# Altium schematic symbol library jlcpcb_2025_04_resistors_extended_2512.schlib: 2667 symbols (part 7 of 14) (continued)
## FRC2512J6R8 TS
designator R?  Resistance: 6.8Ω  (hidden comment: *)
Resistor, 6.8Ω, ±5%, 1W, 200V, ±200ppm/℃, -55℃~+155℃, SMD 2512; Manufacturer: Uniroyal; Manufacturer Part Number: FRC2512J6R8 TS; Supplier 1: LCSC; Supplier Part Number 1: C2960713; JLCPCB Part Number: C2960713; Power Rating: 1W; Category: Resistors; Package Size: 2512; JLCPCB Basic Part: Yes; Tolerance: ±5%; Voltage Rating: 200V; Temperature Coefficient: ±200ppm/℃; Temperature Rating: -55℃~+155℃; ComponentLink1Description: Datasheet; ComponentLink1URL: https://wmsc.lcsc.com/wmsc/upload/file/pdf/v2/lcsc/2308241947_FOJAN-FRC2512J6R8-TS_C2960713.pdf; ComponentLink2Description: JLCPCB Part URL; ComponentLink2URL: https://jlcpcb.com/partdetail/C2960713
pins: 1, 2
1 alternate drawing of the same symbol

## FRC2512J7R5 TS
designator R?  Resistance: 7.5Ω  (hidden comment: *)
Resistor, 7.5Ω, ±5%, 1W, 200V, ±200ppm/℃, -55℃~+155℃, SMD 2512; Manufacturer: Uniroyal; Manufacturer Part Number: FRC2512J7R5 TS; Supplier 1: LCSC; Supplier Part Number 1: C2960779; JLCPCB Part Number: C2960779; Power Rating: 1W; Category: Resistors; Package Size: 2512; JLCPCB Basic Part: Yes; Tolerance: ±5%; Voltage Rating: 200V; Temperature Coefficient: ±200ppm/℃; Temperature Rating: -55℃~+155℃; ComponentLink1Description: Datasheet; ComponentLink1URL: https://wmsc.lcsc.com/wmsc/upload/file/pdf/v2/lcsc/2308241947_FOJAN-FRC2512J7R5-TS_C2960779.pdf; ComponentLink2Description: JLCPCB Part URL; ComponentLink2URL: https://jlcpcb.com/partdetail/C2960779
pins: 1, 2
1 alternate drawing of the same symbol

## FRC2512J8R2 TS
designator R?  Resistance: 8.2Ω  (hidden comment: *)
Resistor, 8.2Ω, ±5%, 1W, 200V, ±200ppm/℃, -55℃~+155℃, SMD 2512; Manufacturer: Uniroyal; Manufacturer Part Number: FRC2512J8R2 TS; Supplier 1: LCSC; Supplier Part Number 1: C2960686; JLCPCB Part Number: C2960686; Power Rating: 1W; Category: Resistors; Package Size: 2512; JLCPCB Basic Part: Yes; Tolerance: ±5%; Voltage Rating: 200V; Temperature Coefficient: ±200ppm/℃; Temperature Rating: -55℃~+155℃; ComponentLink1Description: Datasheet; ComponentLink1URL: https://wmsc.lcsc.com/wmsc/upload/file/pdf/v2/lcsc/2308241947_FOJAN-FRC2512J8R2-TS_C2960686.pdf; ComponentLink2Description: JLCPCB Part URL; ComponentLink2URL: https://jlcpcb.com/partdetail/C2960686
pins: 1, 2
1 alternate drawing of the same symbol

## FRC2512J100 TS
designator R?  Resistance: 10Ω  (hidden comment: *)
Resistor, 10Ω, ±5%, 1W, 200V, ±100ppm/℃, -55℃~+155℃, SMD 2512; Manufacturer: Uniroyal; Manufacturer Part Number: FRC2512J100 TS; Supplier 1: LCSC; Supplier Part Number 1: C2907570; JLCPCB Part Number: C2907570; Power Rating: 1W; Category: Resistors; Package Size: 2512; JLCPCB Basic Part: Yes; Tolerance: ±5%; Voltage Rating: 200V; Temperature Coefficient: ±100ppm/℃; Temperature Rating: -55℃~+155℃; ComponentLink1Description: Datasheet; ComponentLink1URL: https://wmsc.lcsc.com/wmsc/upload/file/pdf/v2/lcsc/2308241009_FOJAN-FRC2512J100-TS_C2907570.pdf; ComponentLink2Description: JLCPCB Part URL; ComponentLink2URL: https://jlcpcb.com/partdetail/C2907570
pins: 1, 2
1 alternate drawing of the same symbol

## FRC2512J101 TS
designator R?  Resistance: 100Ω  (hidden comment: *)
Resistor, 100Ω, ±5%, 1W, 200V, ±100ppm/℃, -55℃~+155℃, SMD 2512; Manufacturer: Uniroyal; Manufacturer Part Number: FRC2512J101 TS; Supplier 1: LCSC; Supplier Part Number 1: C2907569; JLCPCB Part Number: C2907569; Power Rating: 1W; Category: Resistors; Package Size: 2512; JLCPCB Basic Part: Yes; Tolerance: ±5%; Voltage Rating: 200V; Temperature Coefficient: ±100ppm/℃; Temperature Rating: -55℃~+155℃; ComponentLink1Description: Datasheet; ComponentLink1URL: https://wmsc.lcsc.com/wmsc/upload/file/pdf/v2/lcsc/2308241009_FOJAN-FRC2512J101-TS_C2907569.pdf; ComponentLink2Description: JLCPCB Part URL; ComponentLink2URL: https://jlcpcb.com/partdetail/C2907569
pins: 1, 2
1 alternate drawing of the same symbol

## FRC2512J102 TS
designator R?  Resistance: 1kΩ  (hidden comment: *)
Resistor, 1kΩ, ±5%, 1W, 200V, ±100ppm/℃, -55℃~+155℃, SMD 2512; Manufacturer: Uniroyal; Manufacturer Part Number: FRC2512J102 TS; Supplier 1: LCSC; Supplier Part Number 1: C2960674; JLCPCB Part Number: C2960674; Power Rating: 1W; Category: Resistors; Package Size: 2512; JLCPCB Basic Part: Yes; Tolerance: ±5%; Voltage Rating: 200V; Temperature Coefficient: ±100ppm/℃; Temperature Rating: -55℃~+155℃; ComponentLink1Description: Datasheet; ComponentLink1URL: https://wmsc.lcsc.com/wmsc/upload/file/pdf/v2/lcsc/2308241947_FOJAN-FRC2512J102-TS_C2960674.pdf; ComponentLink2Description: JLCPCB Part URL; ComponentLink2URL: https://jlcpcb.com/partdetail/C2960674
pins: 1, 2
1 alternate drawing of the same symbol

## FRC2512J103 TS
designator R?  Resistance: 10kΩ  (hidden comment: *)
Resistor, 10kΩ, ±5%, 1W, 200V, ±100ppm/℃, -55℃~+155℃, SMD 2512; Manufacturer: Uniroyal; Manufacturer Part Number: FRC2512J103 TS; Supplier 1: LCSC; Supplier Part Number 1: C2974112; JLCPCB Part Number: C2974112; Power Rating: 1W; Category: Resistors; Package Size: 2512; JLCPCB Basic Part: Yes; Tolerance: ±5%; Voltage Rating: 200V; Temperature Coefficient: ±100ppm/℃; Temperature Rating: -55℃~+155℃; ComponentLink1Description: Datasheet; ComponentLink1URL: https://wmsc.lcsc.com/wmsc/upload/file/pdf/v2/lcsc/2202151130_FOJAN-FRC2512J103-TS_C2974112.pdf; ComponentLink2Description: JLCPCB Part URL; ComponentLink2URL: https://jlcpcb.com/partdetail/C2974112
pins: 1, 2
1 alternate drawing of the same symbol

## FRC2512J104 TS
designator R?  Resistance: 100kΩ  (hidden comment: *)
Resistor, 100kΩ, ±5%, 1W, 200V, ±100ppm/℃, -55℃~+155℃, SMD 2512; Manufacturer: Uniroyal; Manufacturer Part Number: FRC2512J104 TS; Supplier 1: LCSC; Supplier Part Number 1: C2907568; JLCPCB Part Number: C2907568; Power Rating: 1W; Category: Resistors; Package Size: 2512; JLCPCB Basic Part: Yes; Tolerance: ±5%; Voltage Rating: 200V; Temperature Coefficient: ±100ppm/℃; Temperature Rating: -55℃~+155℃; ComponentLink1Description: Datasheet; ComponentLink1URL: https://wmsc.lcsc.com/wmsc/upload/file/pdf/v2/lcsc/2308241009_FOJAN-FRC2512J104-TS_C2907568.pdf; ComponentLink2Description: JLCPCB Part URL; ComponentLink2URL: https://jlcpcb.com/partdetail/C2907568
pins: 1, 2
1 alternate drawing of the same symbol

## FRC2512J105 TS
designator R?  Resistance: 1MΩ  (hidden comment: *)
Resistor, 1MΩ, ±5%, 1W, 200V, ±100ppm/℃, -55℃~+155℃, SMD 2512; Manufacturer: Uniroyal; Manufacturer Part Number: FRC2512J105 TS; Supplier 1: LCSC; Supplier Part Number 1: C2934080; JLCPCB Part Number: C2934080; Power Rating: 1W; Category: Resistors; Package Size: 2512; JLCPCB Basic Part: Yes; Tolerance: ±5%; Voltage Rating: 200V; Temperature Coefficient: ±100ppm/℃; Temperature Rating: -55℃~+155℃; ComponentLink1Description: Datasheet; ComponentLink1URL: https://wmsc.lcsc.com/wmsc/upload/file/pdf/v2/lcsc/2308241947_FOJAN-FRC2512J105-TS_C2934080.pdf; ComponentLink2Description: JLCPCB Part URL; ComponentLink2URL: https://jlcpcb.com/partdetail/C2934080
pins: 1, 2
1 alternate drawing of the same symbol

## FRC2512J106 TS
designator R?  Resistance: 10MΩ  (hidden comment: *)
Resistor, 10MΩ, ±5%, 1W, 200V, ±100ppm/℃, -55℃~+155℃, SMD 2512; Manufacturer: Uniroyal; Manufacturer Part Number: FRC2512J106 TS; Supplier 1: LCSC; Supplier Part Number 1: C2934081; JLCPCB Part Number: C2934081; Power Rating: 1W; Category: Resistors; Package Size: 2512; JLCPCB Basic Part: Yes; Tolerance: ±5%; Voltage Rating: 200V; Temperature Coefficient: ±100ppm/℃; Temperature Rating: -55℃~+155℃; ComponentLink1Description: Datasheet; ComponentLink1URL: https://wmsc.lcsc.com/wmsc/upload/file/pdf/v2/lcsc/2308241947_FOJAN-FRC2512J106-TS_C2934081.pdf; ComponentLink2Description: JLCPCB Part URL; ComponentLink2URL: https://jlcpcb.com/partdetail/C2934081
pins: 1, 2
1 alternate drawing of the same symbol

## FRC2512J111 TS
designator R?  Resistance: 110Ω  (hidden comment: *)
Resistor, 110Ω, ±5%, 1W, 200V, ±100ppm/℃, -55℃~+155℃, SMD 2512; Manufacturer: Uniroyal; Manufacturer Part Number: FRC2512J111 TS; Supplier 1: LCSC; Supplier Part Number 1: C2934082; JLCPCB Part Number: C2934082; Power Rating: 1W; Category: Resistors; Package Size: 2512; JLCPCB Basic Part: Yes; Tolerance: ±5%; Voltage Rating: 200V; Temperature Coefficient: ±100ppm/℃; Temperature Rating: -55℃~+155℃; ComponentLink1Description: Datasheet; ComponentLink1URL: https://wmsc.lcsc.com/wmsc/upload/file/pdf/v2/lcsc/2308241947_FOJAN-FRC2512J111-TS_C2934082.pdf; ComponentLink2Description: JLCPCB Part URL; ComponentLink2URL: https://jlcpcb.com/partdetail/C2934082
pins: 1, 2
1 alternate drawing of the same symbol

## FRC2512J114 TS
designator R?  Resistance: 110kΩ  (hidden comment: *)
Resistor, 110kΩ, ±5%, 1W, 200V, ±100ppm/℃, -55℃~+155℃, SMD 2512; Manufacturer: Uniroyal; Manufacturer Part Number: FRC2512J114 TS; Supplier 1: LCSC; Supplier Part Number 1: C2934083; JLCPCB Part Number: C2934083; Power Rating: 1W; Category: Resistors; Package Size: 2512; JLCPCB Basic Part: Yes; Tolerance: ±5%; Voltage Rating: 200V; Temperature Coefficient: ±100ppm/℃; Temperature Rating: -55℃~+155℃; ComponentLink1Description: Datasheet; ComponentLink1URL: https://wmsc.lcsc.com/wmsc/upload/file/pdf/v2/lcsc/2308241947_FOJAN-FRC2512J114-TS_C2934083.pdf; ComponentLink2Description: JLCPCB Part URL; ComponentLink2URL: https://jlcpcb.com/partdetail/C2934083
pins: 1, 2
1 alternate drawing of the same symbol

## FRC2512J120 TS
designator R?  Resistance: 12Ω  (hidden comment: *)
Resistor, 12Ω, ±5%, 1W, 200V, ±100ppm/℃, -55℃~+155℃, SMD 2512; Manufacturer: Uniroyal; Manufacturer Part Number: FRC2512J120 TS; Supplier 1: LCSC; Supplier Part Number 1: C2934084; JLCPCB Part Number: C2934084; Power Rating: 1W; Category: Resistors; Package Size: 2512; JLCPCB Basic Part: Yes; Tolerance: ±5%; Voltage Rating: 200V; Temperature Coefficient: ±100ppm/℃; Temperature Rating: -55℃~+155℃; ComponentLink1Description: Datasheet; ComponentLink1URL: https://wmsc.lcsc.com/wmsc/upload/file/pdf/v2/lcsc/2308241947_FOJAN-FRC2512J120-TS_C2934084.pdf; ComponentLink2Description: JLCPCB Part URL; ComponentLink2URL: https://jlcpcb.com/partdetail/C2934084
pins: 1, 2
1 alternate drawing of the same symbol

## FRC2512J121 TS
designator R?  Resistance: 120Ω  (hidden comment: *)
Resistor, 120Ω, ±5%, 1W, 200V, ±100ppm/℃, -55℃~+155℃, SMD 2512; Manufacturer: Uniroyal; Manufacturer Part Number: FRC2512J121 TS; Supplier 1: LCSC; Supplier Part Number 1: C2907571; JLCPCB Part Number: C2907571; Power Rating: 1W; Category: Resistors; Package Size: 2512; JLCPCB Basic Part: Yes; Tolerance: ±5%; Voltage Rating: 200V; Temperature Coefficient: ±100ppm/℃; Temperature Rating: -55℃~+155℃; ComponentLink1Description: Datasheet; ComponentLink1URL: https://wmsc.lcsc.com/wmsc/upload/file/pdf/v2/lcsc/2308241009_FOJAN-FRC2512J121-TS_C2907571.pdf; ComponentLink2Description: JLCPCB Part URL; ComponentLink2URL: https://jlcpcb.com/partdetail/C2907571
pins: 1, 2
1 alternate drawing of the same symbol

## FRC2512J122 TS
designator R?  Resistance: 1.2kΩ  (hidden comment: *)
Resistor, 1.2kΩ, ±5%, 1W, 200V, ±100ppm/℃, -55℃~+155℃, SMD 2512; Manufacturer: Uniroyal; Manufacturer Part Number: FRC2512J122 TS; Supplier 1: LCSC; Supplier Part Number 1: C2934085; JLCPCB Part Number: C2934085; Power Rating: 1W; Category: Resistors; Package Size: 2512; JLCPCB Basic Part: Yes; Tolerance: ±5%; Voltage Rating: 200V; Temperature Coefficient: ±100ppm/℃; Temperature Rating: -55℃~+155℃; ComponentLink1Description: Datasheet; ComponentLink1URL: https://wmsc.lcsc.com/wmsc/upload/file/pdf/v2/lcsc/2308241947_FOJAN-FRC2512J122-TS_C2934085.pdf; ComponentLink2Description: JLCPCB Part URL; ComponentLink2URL: https://jlcpcb.com/partdetail/C2934085
pins: 1, 2
1 alternate drawing of the same symbol

## FRC2512J123 TS
designator R?  Resistance: 12kΩ  (hidden comment: *)
Resistor, 12kΩ, ±5%, 1W, 200V, ±100ppm/℃, -55℃~+155℃, SMD 2512; Manufacturer: Uniroyal; Manufacturer Part Number: FRC2512J123 TS; Supplier 1: LCSC; Supplier Part Number 1: C2934086; JLCPCB Part Number: C2934086; Power Rating: 1W; Category: Resistors; Package Size: 2512; JLCPCB Basic Part: Yes; Tolerance: ±5%; Voltage Rating: 200V; Temperature Coefficient: ±100ppm/℃; Temperature Rating: -55℃~+155℃; ComponentLink1Description: Datasheet; ComponentLink1URL: https://wmsc.lcsc.com/wmsc/upload/file/pdf/v2/lcsc/2308241947_FOJAN-FRC2512J123-TS_C2934086.pdf; ComponentLink2Description: JLCPCB Part URL; ComponentLink2URL: https://jlcpcb.com/partdetail/C2934086
pins: 1, 2
1 alternate drawing of the same symbol

## FRC2512J124 TS
designator R?  Resistance: 120kΩ  (hidden comment: *)
Resistor, 120kΩ, ±5%, 1W, 200V, ±100ppm/℃, -55℃~+155℃, SMD 2512; Manufacturer: Uniroyal; Manufacturer Part Number: FRC2512J124 TS; Supplier 1: LCSC; Supplier Part Number 1: C2934087; JLCPCB Part Number: C2934087; Power Rating: 1W; Category: Resistors; Package Size: 2512; JLCPCB Basic Part: Yes; Tolerance: ±5%; Voltage Rating: 200V; Temperature Coefficient: ±100ppm/℃; Temperature Rating: -55℃~+155℃; ComponentLink1Description: Datasheet; ComponentLink1URL: https://wmsc.lcsc.com/wmsc/upload/file/pdf/v2/lcsc/2308241947_FOJAN-FRC2512J124-TS_C2934087.pdf; ComponentLink2Description: JLCPCB Part URL; ComponentLink2URL: https://jlcpcb.com/partdetail/C2934087
pins: 1, 2
1 alternate drawing of the same symbol

## FRC2512J130 TS
designator R?  Resistance: 13Ω  (hidden comment: *)
Resistor, 13Ω, ±5%, 1W, 200V, ±100ppm/℃, -55℃~+155℃, SMD 2512; Manufacturer: Uniroyal; Manufacturer Part Number: FRC2512J130 TS; Supplier 1: LCSC; Supplier Part Number 1: C2934088; JLCPCB Part Number: C2934088; Power Rating: 1W; Category: Resistors; Package Size: 2512; JLCPCB Basic Part: Yes; Tolerance: ±5%; Voltage Rating: 200V; Temperature Coefficient: ±100ppm/℃; Temperature Rating: -55℃~+155℃; ComponentLink1Description: Datasheet; ComponentLink1URL: https://wmsc.lcsc.com/wmsc/upload/file/pdf/v2/lcsc/2308241947_FOJAN-FRC2512J130-TS_C2934088.pdf; ComponentLink2Description: JLCPCB Part URL; ComponentLink2URL: https://jlcpcb.com/partdetail/C2934088
pins: 1, 2
1 alternate drawing of the same symbol

## FRC2512J132 TS
designator R?  Resistance: 1.3kΩ  (hidden comment: *)
Resistor, 1.3kΩ, ±5%, 1W, 200V, ±100ppm/℃, -55℃~+155℃, SMD 2512; Manufacturer: Uniroyal; Manufacturer Part Number: FRC2512J132 TS; Supplier 1: LCSC; Supplier Part Number 1: C2934089; JLCPCB Part Number: C2934089; Power Rating: 1W; Category: Resistors; Package Size: 2512; JLCPCB Basic Part: Yes; Tolerance: ±5%; Voltage Rating: 200V; Temperature Coefficient: ±100ppm/℃; Temperature Rating: -55℃~+155℃; ComponentLink1Description: Datasheet; ComponentLink1URL: https://wmsc.lcsc.com/wmsc/upload/file/pdf/v2/lcsc/2308241947_FOJAN-FRC2512J132-TS_C2934089.pdf; ComponentLink2Description: JLCPCB Part URL; ComponentLink2URL: https://jlcpcb.com/partdetail/C2934089
pins: 1, 2
1 alternate drawing of the same symbol

## FRC2512J150 TS
designator R?  Resistance: 15Ω  (hidden comment: *)
Resistor, 15Ω, ±5%, 1W, 200V, ±100ppm/℃, -55℃~+155℃, SMD 2512; Manufacturer: Uniroyal; Manufacturer Part Number: FRC2512J150 TS; Supplier 1: LCSC; Supplier Part Number 1: C2907572; JLCPCB Part Number: C2907572; Power Rating: 1W; Category: Resistors; Package Size: 2512; JLCPCB Basic Part: Yes; Tolerance: ±5%; Voltage Rating: 200V; Temperature Coefficient: ±100ppm/℃; Temperature Rating: -55℃~+155℃; ComponentLink1Description: Datasheet; ComponentLink1URL: https://wmsc.lcsc.com/wmsc/upload/file/pdf/v2/lcsc/2308241009_FOJAN-FRC2512J150-TS_C2907572.pdf; ComponentLink2Description: JLCPCB Part URL; ComponentLink2URL: https://jlcpcb.com/partdetail/C2907572
pins: 1, 2
1 alternate drawing of the same symbol

## FRC2512J151 TS
designator R?  Resistance: 150Ω  (hidden comment: *)
Resistor, 150Ω, ±5%, 1W, 200V, ±100ppm/℃, -55℃~+155℃, SMD 2512; Manufacturer: Uniroyal; Manufacturer Part Number: FRC2512J151 TS; Supplier 1: LCSC; Supplier Part Number 1: C2960755; JLCPCB Part Number: C2960755; Power Rating: 1W; Category: Resistors; Package Size: 2512; JLCPCB Basic Part: Yes; Tolerance: ±5%; Voltage Rating: 200V; Temperature Coefficient: ±100ppm/℃; Temperature Rating: -55℃~+155℃; ComponentLink1Description: Datasheet; ComponentLink1URL: https://wmsc.lcsc.com/wmsc/upload/file/pdf/v2/lcsc/2308241947_FOJAN-FRC2512J151-TS_C2960755.pdf; ComponentLink2Description: JLCPCB Part URL; ComponentLink2URL: https://jlcpcb.com/partdetail/C2960755
pins: 1, 2
1 alternate drawing of the same symbol

## FRC2512J153 TS
designator R?  Resistance: 15kΩ  (hidden comment: *)
Resistor, 15kΩ, ±5%, SMD 2512; Manufacturer: Uniroyal; Manufacturer Part Number: FRC2512J153 TS; Supplier 1: LCSC; Supplier Part Number 1: C3013327; JLCPCB Part Number: C3013327; Category: Resistors; Package Size: 2512; JLCPCB Basic Part: Yes; Tolerance: ±5%; ComponentLink1Description: Datasheet; ComponentLink1URL: https://wmsc.lcsc.com/wmsc/upload/file/pdf/v2/lcsc/2308241947_FOJAN-FRC2512J153-TS_C3013327.pdf; ComponentLink2Description: JLCPCB Part URL; ComponentLink2URL: https://jlcpcb.com/partdetail/C3013327
pins: 1, 2
1 alternate drawing of the same symbol

## FRC2512J154 TS
designator R?  Resistance: 150kΩ  (hidden comment: *)
Resistor, 150kΩ, ±5%, 1W, 200V, ±100ppm/℃, -55℃~+155℃, SMD 2512; Manufacturer: Uniroyal; Manufacturer Part Number: FRC2512J154 TS; Supplier 1: LCSC; Supplier Part Number 1: C2934090; JLCPCB Part Number: C2934090; Power Rating: 1W; Category: Resistors; Package Size: 2512; JLCPCB Basic Part: Yes; Tolerance: ±5%; Voltage Rating: 200V; Temperature Coefficient: ±100ppm/℃; Temperature Rating: -55℃~+155℃; ComponentLink1Description: Datasheet; ComponentLink1URL: https://wmsc.lcsc.com/wmsc/upload/file/pdf/v2/lcsc/2308241947_FOJAN-FRC2512J154-TS_C2934090.pdf; ComponentLink2Description: JLCPCB Part URL; ComponentLink2URL: https://jlcpcb.com/partdetail/C2934090
pins: 1, 2
1 alternate drawing of the same symbol

## FRC2512J161 TS
designator R?  Resistance: 160Ω  (hidden comment: *)
Resistor, 160Ω, ±5%, 1W, 200V, ±100ppm/℃, -55℃~+155℃, SMD 2512; Manufacturer: Uniroyal; Manufacturer Part Number: FRC2512J161 TS; Supplier 1: LCSC; Supplier Part Number 1: C2907573; JLCPCB Part Number: C2907573; Power Rating: 1W; Category: Resistors; Package Size: 2512; JLCPCB Basic Part: Yes; Tolerance: ±5%; Voltage Rating: 200V; Temperature Coefficient: ±100ppm/℃; Temperature Rating: -55℃~+155℃; ComponentLink1Description: Datasheet; ComponentLink1URL: https://wmsc.lcsc.com/wmsc/upload/file/pdf/v2/lcsc/2308241009_FOJAN-FRC2512J161-TS_C2907573.pdf; ComponentLink2Description: JLCPCB Part URL; ComponentLink2URL: https://jlcpcb.com/partdetail/C2907573
pins: 1, 2
1 alternate drawing of the same symbol

## FRC2512J162 TS
designator R?  Resistance: 1.6kΩ  (hidden comment: *)
Resistor, 1.6kΩ, ±5%, 1W, 200V, ±100ppm/℃, -55℃~+155℃, SMD 2512; Manufacturer: Uniroyal; Manufacturer Part Number: FRC2512J162 TS; Supplier 1: LCSC; Supplier Part Number 1: C2934091; JLCPCB Part Number: C2934091; Power Rating: 1W; Category: Resistors; Package Size: 2512; JLCPCB Basic Part: Yes; Tolerance: ±5%; Voltage Rating: 200V; Temperature Coefficient: ±100ppm/℃; Temperature Rating: -55℃~+155℃; ComponentLink1Description: Datasheet; ComponentLink1URL: https://wmsc.lcsc.com/wmsc/upload/file/pdf/v2/lcsc/2308241947_FOJAN-FRC2512J162-TS_C2934091.pdf; ComponentLink2Description: JLCPCB Part URL; ComponentLink2URL: https://jlcpcb.com/partdetail/C2934091
pins: 1, 2
1 alternate drawing of the same symbol

## FRC2512J164 TS
designator R?  Resistance: 160kΩ  (hidden comment: *)
Resistor, 160kΩ, ±5%, 1W, 200V, ±100ppm/℃, -55℃~+155℃, SMD 2512; Manufacturer: Uniroyal; Manufacturer Part Number: FRC2512J164 TS; Supplier 1: LCSC; Supplier Part Number 1: C2934092; JLCPCB Part Number: C2934092; Power Rating: 1W; Category: Resistors; Package Size: 2512; JLCPCB Basic Part: Yes; Tolerance: ±5%; Voltage Rating: 200V; Temperature Coefficient: ±100ppm/℃; Temperature Rating: -55℃~+155℃; ComponentLink1Description: Datasheet; ComponentLink1URL: https://wmsc.lcsc.com/wmsc/upload/file/pdf/v2/lcsc/2308241947_FOJAN-FRC2512J164-TS_C2934092.pdf; ComponentLink2Description: JLCPCB Part URL; ComponentLink2URL: https://jlcpcb.com/partdetail/C2934092
pins: 1, 2
1 alternate drawing of the same symbol

## FRC2512J180 TS
designator R?  Resistance: 18Ω  (hidden comment: *)
Resistor, 18Ω, ±5%, 1W, 200V, ±100ppm/℃, -55℃~+155℃, SMD 2512; Manufacturer: Uniroyal; Manufacturer Part Number: FRC2512J180 TS; Supplier 1: LCSC; Supplier Part Number 1: C2934093; JLCPCB Part Number: C2934093; Power Rating: 1W; Category: Resistors; Package Size: 2512; JLCPCB Basic Part: Yes; Tolerance: ±5%; Voltage Rating: 200V; Temperature Coefficient: ±100ppm/℃; Temperature Rating: -55℃~+155℃; ComponentLink1Description: Datasheet; ComponentLink1URL: https://wmsc.lcsc.com/wmsc/upload/file/pdf/v2/lcsc/2308241947_FOJAN-FRC2512J180-TS_C2934093.pdf; ComponentLink2Description: JLCPCB Part URL; ComponentLink2URL: https://jlcpcb.com/partdetail/C2934093
pins: 1, 2
1 alternate drawing of the same symbol

## FRC2512J181 TS
designator R?  Resistance: 180Ω  (hidden comment: *)
Resistor, 180Ω, ±5%, 1W, 200V, ±100ppm/℃, -55℃~+155℃, SMD 2512; Manufacturer: Uniroyal; Manufacturer Part Number: FRC2512J181 TS; Supplier 1: LCSC; Supplier Part Number 1: C2934094; JLCPCB Part Number: C2934094; Power Rating: 1W; Category: Resistors; Package Size: 2512; JLCPCB Basic Part: Yes; Tolerance: ±5%; Voltage Rating: 200V; Temperature Coefficient: ±100ppm/℃; Temperature Rating: -55℃~+155℃; ComponentLink1Description: Datasheet; ComponentLink1URL: https://wmsc.lcsc.com/wmsc/upload/file/pdf/v2/lcsc/2308241947_FOJAN-FRC2512J181-TS_C2934094.pdf; ComponentLink2Description: JLCPCB Part URL; ComponentLink2URL: https://jlcpcb.com/partdetail/C2934094
pins: 1, 2
1 alternate drawing of the same symbol

## FRC2512J182 TS
designator R?  Resistance: 1.8kΩ  (hidden comment: *)
Resistor, 1.8kΩ, ±5%, 1W, 200V, ±100ppm/℃, -55℃~+155℃, SMD 2512; Manufacturer: Uniroyal; Manufacturer Part Number: FRC2512J182 TS; Supplier 1: LCSC; Supplier Part Number 1: C2934095; JLCPCB Part Number: C2934095; Power Rating: 1W; Category: Resistors; Package Size: 2512; JLCPCB Basic Part: Yes; Tolerance: ±5%; Voltage Rating: 200V; Temperature Coefficient: ±100ppm/℃; Temperature Rating: -55℃~+155℃; ComponentLink1Description: Datasheet; ComponentLink1URL: https://wmsc.lcsc.com/wmsc/upload/file/pdf/v2/lcsc/2308241947_FOJAN-FRC2512J182-TS_C2934095.pdf; ComponentLink2Description: JLCPCB Part URL; ComponentLink2URL: https://jlcpcb.com/partdetail/C2934095
pins: 1, 2
1 alternate drawing of the same symbol

## FRC2512J183 TS
designator R?  Resistance: 18kΩ  (hidden comment: *)
Resistor, 18kΩ, ±5%, 1W, 200V, ±100ppm/℃, -55℃~+155℃, SMD 2512; Manufacturer: Uniroyal; Manufacturer Part Number: FRC2512J183 TS; Supplier 1: LCSC; Supplier Part Number 1: C2960675; JLCPCB Part Number: C2960675; Power Rating: 1W; Category: Resistors; Package Size: 2512; JLCPCB Basic Part: Yes; Tolerance: ±5%; Voltage Rating: 200V; Temperature Coefficient: ±100ppm/℃; Temperature Rating: -55℃~+155℃; ComponentLink1Description: Datasheet; ComponentLink1URL: https://wmsc.lcsc.com/wmsc/upload/file/pdf/v2/lcsc/2308241947_FOJAN-FRC2512J183-TS_C2960675.pdf; ComponentLink2Description: JLCPCB Part URL; ComponentLink2URL: https://jlcpcb.com/partdetail/C2960675
pins: 1, 2
1 alternate drawing of the same symbol

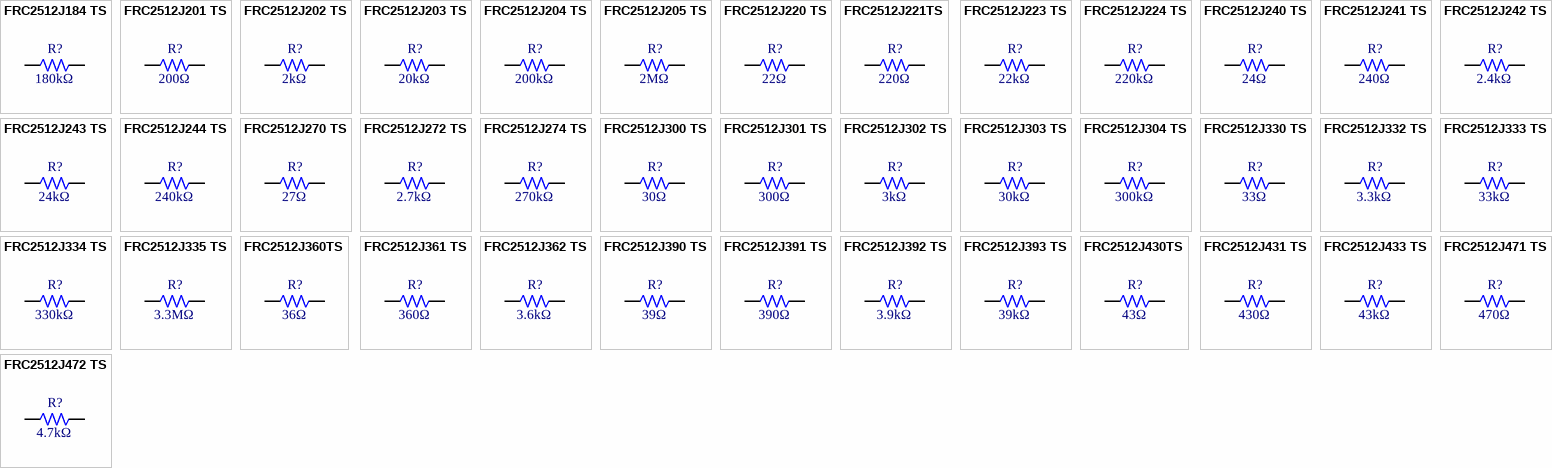
[diagram p34: symbols FRC2512J184 TS to FRC2512J472 TS]

## FRC2512J184 TS
designator R?  Resistance: 180kΩ  (hidden comment: *)
Resistor, 180kΩ, ±5%, 1W, 200V, ±100ppm/℃, -55℃~+155℃, SMD 2512; Manufacturer: Uniroyal; Manufacturer Part Number: FRC2512J184 TS; Supplier 1: LCSC; Supplier Part Number 1: C2960914; JLCPCB Part Number: C2960914; Power Rating: 1W; Category: Resistors; Package Size: 2512; JLCPCB Basic Part: Yes; Tolerance: ±5%; Voltage Rating: 200V; Temperature Coefficient: ±100ppm/℃; Temperature Rating: -55℃~+155℃; ComponentLink1Description: Datasheet; ComponentLink1URL: https://wmsc.lcsc.com/wmsc/upload/file/pdf/v2/lcsc/2308241947_FOJAN-FRC2512J184-TS_C2960914.pdf; ComponentLink2Description: JLCPCB Part URL; ComponentLink2URL: https://jlcpcb.com/partdetail/C2960914
pins: 1, 2
1 alternate drawing of the same symbol

## FRC2512J201 TS
designator R?  Resistance: 200Ω  (hidden comment: *)
Resistor, 200Ω, ±5%, 1W, 200V, ±100ppm/℃, -55℃~+155℃, SMD 2512; Manufacturer: Uniroyal; Manufacturer Part Number: FRC2512J201 TS; Supplier 1: LCSC; Supplier Part Number 1: C2907575; JLCPCB Part Number: C2907575; Power Rating: 1W; Category: Resistors; Package Size: 2512; JLCPCB Basic Part: Yes; Tolerance: ±5%; Voltage Rating: 200V; Temperature Coefficient: ±100ppm/℃; Temperature Rating: -55℃~+155℃; ComponentLink1Description: Datasheet; ComponentLink1URL: https://wmsc.lcsc.com/wmsc/upload/file/pdf/v2/lcsc/2308241009_FOJAN-FRC2512J201-TS_C2907575.pdf; ComponentLink2Description: JLCPCB Part URL; ComponentLink2URL: https://jlcpcb.com/partdetail/C2907575
pins: 1, 2
1 alternate drawing of the same symbol

## FRC2512J202 TS
designator R?  Resistance: 2kΩ  (hidden comment: *)
Resistor, 2kΩ, ±5%, 1W, 200V, ±100ppm/℃, -55℃~+155℃, SMD 2512; Manufacturer: Uniroyal; Manufacturer Part Number: FRC2512J202 TS; Supplier 1: LCSC; Supplier Part Number 1: C2907579; JLCPCB Part Number: C2907579; Power Rating: 1W; Category: Resistors; Package Size: 2512; JLCPCB Basic Part: Yes; Tolerance: ±5%; Voltage Rating: 200V; Temperature Coefficient: ±100ppm/℃; Temperature Rating: -55℃~+155℃; ComponentLink1Description: Datasheet; ComponentLink1URL: https://wmsc.lcsc.com/wmsc/upload/file/pdf/v2/lcsc/2308241009_FOJAN-FRC2512J202-TS_C2907579.pdf; ComponentLink2Description: JLCPCB Part URL; ComponentLink2URL: https://jlcpcb.com/partdetail/C2907579
pins: 1, 2
1 alternate drawing of the same symbol

## FRC2512J203 TS
designator R?  Resistance: 20kΩ  (hidden comment: *)
Resistor, 20kΩ, ±5%, 1W, 200V, ±100ppm/℃, -55℃~+155℃, SMD 2512; Manufacturer: Uniroyal; Manufacturer Part Number: FRC2512J203 TS; Supplier 1: LCSC; Supplier Part Number 1: C2934096; JLCPCB Part Number: C2934096; Power Rating: 1W; Category: Resistors; Package Size: 2512; JLCPCB Basic Part: Yes; Tolerance: ±5%; Voltage Rating: 200V; Temperature Coefficient: ±100ppm/℃; Temperature Rating: -55℃~+155℃; ComponentLink1Description: Datasheet; ComponentLink1URL: https://wmsc.lcsc.com/wmsc/upload/file/pdf/v2/lcsc/2308241947_FOJAN-FRC2512J203-TS_C2934096.pdf; ComponentLink2Description: JLCPCB Part URL; ComponentLink2URL: https://jlcpcb.com/partdetail/C2934096
pins: 1, 2
1 alternate drawing of the same symbol

## FRC2512J204 TS
designator R?  Resistance: 200kΩ  (hidden comment: *)
Resistor, 200kΩ, ±5%, 1W, 200V, ±100ppm/℃, -55℃~+155℃, SMD 2512; Manufacturer: Uniroyal; Manufacturer Part Number: FRC2512J204 TS; Supplier 1: LCSC; Supplier Part Number 1: C2934097; JLCPCB Part Number: C2934097; Power Rating: 1W; Category: Resistors; Package Size: 2512; JLCPCB Basic Part: Yes; Tolerance: ±5%; Voltage Rating: 200V; Temperature Coefficient: ±100ppm/℃; Temperature Rating: -55℃~+155℃; ComponentLink1Description: Datasheet; ComponentLink1URL: https://wmsc.lcsc.com/wmsc/upload/file/pdf/v2/lcsc/2308241947_FOJAN-FRC2512J204-TS_C2934097.pdf; ComponentLink2Description: JLCPCB Part URL; ComponentLink2URL: https://jlcpcb.com/partdetail/C2934097
pins: 1, 2
1 alternate drawing of the same symbol

## FRC2512J205 TS
designator R?  Resistance: 2MΩ  (hidden comment: *)
Resistor, 2MΩ, ±5%, 1W, 200V, ±100ppm/℃, -55℃~+155℃, SMD 2512; Manufacturer: Uniroyal; Manufacturer Part Number: FRC2512J205 TS; Supplier 1: LCSC; Supplier Part Number 1: C2934098; JLCPCB Part Number: C2934098; Power Rating: 1W; Category: Resistors; Package Size: 2512; JLCPCB Basic Part: Yes; Tolerance: ±5%; Voltage Rating: 200V; Temperature Coefficient: ±100ppm/℃; Temperature Rating: -55℃~+155℃; ComponentLink1Description: Datasheet; ComponentLink1URL: https://wmsc.lcsc.com/wmsc/upload/file/pdf/v2/lcsc/2308241947_FOJAN-FRC2512J205-TS_C2934098.pdf; ComponentLink2Description: JLCPCB Part URL; ComponentLink2URL: https://jlcpcb.com/partdetail/C2934098
pins: 1, 2
1 alternate drawing of the same symbol

## FRC2512J220 TS
designator R?  Resistance: 22Ω  (hidden comment: *)
Resistor, 22Ω, ±5%, 1W, 200V, ±100ppm/℃, -55℃~+155℃, SMD 2512; Manufacturer: Uniroyal; Manufacturer Part Number: FRC2512J220 TS; Supplier 1: LCSC; Supplier Part Number 1: C2974113; JLCPCB Part Number: C2974113; Power Rating: 1W; Category: Resistors; Package Size: 2512; JLCPCB Basic Part: Yes; Tolerance: ±5%; Voltage Rating: 200V; Temperature Coefficient: ±100ppm/℃; Temperature Rating: -55℃~+155℃; ComponentLink1Description: Datasheet; ComponentLink1URL: https://wmsc.lcsc.com/wmsc/upload/file/pdf/v2/lcsc/2308241947_FOJAN-FRC2512J220-TS_C2974113.pdf; ComponentLink2Description: JLCPCB Part URL; ComponentLink2URL: https://jlcpcb.com/partdetail/C2974113
pins: 1, 2
1 alternate drawing of the same symbol

## FRC2512J221TS
designator R?  Resistance: 220Ω  (hidden comment: *)
Resistor, 220Ω, ±5%, 1W, 200V, ±100ppm/℃, -55℃~+155℃, SMD 2512; Manufacturer: Uniroyal; Manufacturer Part Number: FRC2512J221TS; Supplier 1: LCSC; Supplier Part Number 1: C2930459; JLCPCB Part Number: C2930459; Power Rating: 1W; Category: Resistors; Package Size: 2512; JLCPCB Basic Part: Yes; Tolerance: ±5%; Voltage Rating: 200V; Temperature Coefficient: ±100ppm/℃; Temperature Rating: -55℃~+155℃; ComponentLink1Description: Datasheet; ComponentLink1URL: https://wmsc.lcsc.com/wmsc/upload/file/pdf/v2/lcsc/2308241947_FOJAN-FRC2512J221TS_C2930459.pdf; ComponentLink2Description: JLCPCB Part URL; ComponentLink2URL: https://jlcpcb.com/partdetail/C2930459
pins: 1, 2
1 alternate drawing of the same symbol

## FRC2512J223 TS
designator R?  Resistance: 22kΩ  (hidden comment: *)
Resistor, 22kΩ, ±5%, 1W, 200V, ±100ppm/℃, -55℃~+155℃, SMD 2512; Manufacturer: Uniroyal; Manufacturer Part Number: FRC2512J223 TS; Supplier 1: LCSC; Supplier Part Number 1: C2907576; JLCPCB Part Number: C2907576; Power Rating: 1W; Category: Resistors; Package Size: 2512; JLCPCB Basic Part: Yes; Tolerance: ±5%; Voltage Rating: 200V; Temperature Coefficient: ±100ppm/℃; Temperature Rating: -55℃~+155℃; ComponentLink1Description: Datasheet; ComponentLink1URL: https://wmsc.lcsc.com/wmsc/upload/file/pdf/v2/lcsc/2308241009_FOJAN-FRC2512J223-TS_C2907576.pdf; ComponentLink2Description: JLCPCB Part URL; ComponentLink2URL: https://jlcpcb.com/partdetail/C2907576
pins: 1, 2
1 alternate drawing of the same symbol

## FRC2512J224 TS
designator R?  Resistance: 220kΩ  (hidden comment: *)
Resistor, 220kΩ, ±5%, 1W, 200V, ±100ppm/℃, -55℃~+155℃, SMD 2512; Manufacturer: Uniroyal; Manufacturer Part Number: FRC2512J224 TS; Supplier 1: LCSC; Supplier Part Number 1: C2974114; JLCPCB Part Number: C2974114; Power Rating: 1W; Category: Resistors; Package Size: 2512; JLCPCB Basic Part: Yes; Tolerance: ±5%; Voltage Rating: 200V; Temperature Coefficient: ±100ppm/℃; Temperature Rating: -55℃~+155℃; ComponentLink1Description: Datasheet; ComponentLink1URL: https://wmsc.lcsc.com/wmsc/upload/file/pdf/v2/lcsc/2308241947_FOJAN-FRC2512J224-TS_C2974114.pdf; ComponentLink2Description: JLCPCB Part URL; ComponentLink2URL: https://jlcpcb.com/partdetail/C2974114
pins: 1, 2
1 alternate drawing of the same symbol

## FRC2512J240 TS
designator R?  Resistance: 24Ω  (hidden comment: *)
Resistor, 24Ω, ±5%, 1W, 200V, ±100ppm/℃, -55℃~+155℃, SMD 2512; Manufacturer: Uniroyal; Manufacturer Part Number: FRC2512J240 TS; Supplier 1: LCSC; Supplier Part Number 1: C2934100; JLCPCB Part Number: C2934100; Power Rating: 1W; Category: Resistors; Package Size: 2512; JLCPCB Basic Part: Yes; Tolerance: ±5%; Voltage Rating: 200V; Temperature Coefficient: ±100ppm/℃; Temperature Rating: -55℃~+155℃; ComponentLink1Description: Datasheet; ComponentLink1URL: https://wmsc.lcsc.com/wmsc/upload/file/pdf/v2/lcsc/2308241947_FOJAN-FRC2512J240-TS_C2934100.pdf; ComponentLink2Description: JLCPCB Part URL; ComponentLink2URL: https://jlcpcb.com/partdetail/C2934100
pins: 1, 2
1 alternate drawing of the same symbol

## FRC2512J241 TS
designator R?  Resistance: 240Ω  (hidden comment: *)
Resistor, 240Ω, ±5%, 1W, 200V, ±100ppm/℃, -55℃~+155℃, SMD 2512; Manufacturer: Uniroyal; Manufacturer Part Number: FRC2512J241 TS; Supplier 1: LCSC; Supplier Part Number 1: C2934101; JLCPCB Part Number: C2934101; Power Rating: 1W; Category: Resistors; Package Size: 2512; JLCPCB Basic Part: Yes; Tolerance: ±5%; Voltage Rating: 200V; Temperature Coefficient: ±100ppm/℃; Temperature Rating: -55℃~+155℃; ComponentLink1Description: Datasheet; ComponentLink1URL: https://wmsc.lcsc.com/wmsc/upload/file/pdf/v2/lcsc/2308241947_FOJAN-FRC2512J241-TS_C2934101.pdf; ComponentLink2Description: JLCPCB Part URL; ComponentLink2URL: https://jlcpcb.com/partdetail/C2934101
pins: 1, 2
1 alternate drawing of the same symbol

## FRC2512J242 TS
designator R?  Resistance: 2.4kΩ  (hidden comment: *)
Resistor, 2.4kΩ, ±5%, 1W, 200V, ±100ppm/℃, -55℃~+155℃, SMD 2512; Manufacturer: Uniroyal; Manufacturer Part Number: FRC2512J242 TS; Supplier 1: LCSC; Supplier Part Number 1: C2934102; JLCPCB Part Number: C2934102; Power Rating: 1W; Category: Resistors; Package Size: 2512; JLCPCB Basic Part: Yes; Tolerance: ±5%; Voltage Rating: 200V; Temperature Coefficient: ±100ppm/℃; Temperature Rating: -55℃~+155℃; ComponentLink1Description: Datasheet; ComponentLink1URL: https://wmsc.lcsc.com/wmsc/upload/file/pdf/v2/lcsc/2308241947_FOJAN-FRC2512J242-TS_C2934102.pdf; ComponentLink2Description: JLCPCB Part URL; ComponentLink2URL: https://jlcpcb.com/partdetail/C2934102
pins: 1, 2
1 alternate drawing of the same symbol

## FRC2512J243 TS
designator R?  Resistance: 24kΩ  (hidden comment: *)
Resistor, 24kΩ, ±5%, 1W, 200V, ±100ppm/℃, -55℃~+155℃, SMD 2512; Manufacturer: Uniroyal; Manufacturer Part Number: FRC2512J243 TS; Supplier 1: LCSC; Supplier Part Number 1: C2934103; JLCPCB Part Number: C2934103; Power Rating: 1W; Category: Resistors; Package Size: 2512; JLCPCB Basic Part: Yes; Tolerance: ±5%; Voltage Rating: 200V; Temperature Coefficient: ±100ppm/℃; Temperature Rating: -55℃~+155℃; ComponentLink1Description: Datasheet; ComponentLink1URL: https://wmsc.lcsc.com/wmsc/upload/file/pdf/v2/lcsc/2308241947_FOJAN-FRC2512J243-TS_C2934103.pdf; ComponentLink2Description: JLCPCB Part URL; ComponentLink2URL: https://jlcpcb.com/partdetail/C2934103
pins: 1, 2
1 alternate drawing of the same symbol

## FRC2512J244 TS
designator R?  Resistance: 240kΩ  (hidden comment: *)
Resistor, 240kΩ, ±5%, 1W, 200V, ±100ppm/℃, -55℃~+155℃, SMD 2512; Manufacturer: Uniroyal; Manufacturer Part Number: FRC2512J244 TS; Supplier 1: LCSC; Supplier Part Number 1: C2934104; JLCPCB Part Number: C2934104; Power Rating: 1W; Category: Resistors; Package Size: 2512; JLCPCB Basic Part: Yes; Tolerance: ±5%; Voltage Rating: 200V; Temperature Coefficient: ±100ppm/℃; Temperature Rating: -55℃~+155℃; ComponentLink1Description: Datasheet; ComponentLink1URL: https://wmsc.lcsc.com/wmsc/upload/file/pdf/v2/lcsc/2308241947_FOJAN-FRC2512J244-TS_C2934104.pdf; ComponentLink2Description: JLCPCB Part URL; ComponentLink2URL: https://jlcpcb.com/partdetail/C2934104
pins: 1, 2
1 alternate drawing of the same symbol

## FRC2512J270 TS
designator R?  Resistance: 27Ω  (hidden comment: *)
Resistor, 27Ω, ±5%, 1W, 200V, ±100ppm/℃, -55℃~+155℃, SMD 2512; Manufacturer: Uniroyal; Manufacturer Part Number: FRC2512J270 TS; Supplier 1: LCSC; Supplier Part Number 1: C2907578; JLCPCB Part Number: C2907578; Power Rating: 1W; Category: Resistors; Package Size: 2512; JLCPCB Basic Part: Yes; Tolerance: ±5%; Voltage Rating: 200V; Temperature Coefficient: ±100ppm/℃; Temperature Rating: -55℃~+155℃; ComponentLink1Description: Datasheet; ComponentLink1URL: https://wmsc.lcsc.com/wmsc/upload/file/pdf/v2/lcsc/2308241009_FOJAN-FRC2512J270-TS_C2907578.pdf; ComponentLink2Description: JLCPCB Part URL; ComponentLink2URL: https://jlcpcb.com/partdetail/C2907578
pins: 1, 2
1 alternate drawing of the same symbol

## FRC2512J272 TS
designator R?  Resistance: 2.7kΩ  (hidden comment: *)
Resistor, 2.7kΩ, ±5%, 1W, 200V, ±100ppm/℃, -55℃~+155℃, SMD 2512; Manufacturer: Uniroyal; Manufacturer Part Number: FRC2512J272 TS; Supplier 1: LCSC; Supplier Part Number 1: C2934105; JLCPCB Part Number: C2934105; Power Rating: 1W; Category: Resistors; Package Size: 2512; JLCPCB Basic Part: Yes; Tolerance: ±5%; Voltage Rating: 200V; Temperature Coefficient: ±100ppm/℃; Temperature Rating: -55℃~+155℃; ComponentLink1Description: Datasheet; ComponentLink1URL: https://wmsc.lcsc.com/wmsc/upload/file/pdf/v2/lcsc/2308241947_FOJAN-FRC2512J272-TS_C2934105.pdf; ComponentLink2Description: JLCPCB Part URL; ComponentLink2URL: https://jlcpcb.com/partdetail/C2934105
pins: 1, 2
1 alternate drawing of the same symbol

## FRC2512J274 TS
designator R?  Resistance: 270kΩ  (hidden comment: *)
Resistor, 270kΩ, ±5%, 1W, 200V, ±100ppm/℃, -55℃~+155℃, SMD 2512; Manufacturer: Uniroyal; Manufacturer Part Number: FRC2512J274 TS; Supplier 1: LCSC; Supplier Part Number 1: C2960831; JLCPCB Part Number: C2960831; Power Rating: 1W; Category: Resistors; Package Size: 2512; JLCPCB Basic Part: Yes; Tolerance: ±5%; Voltage Rating: 200V; Temperature Coefficient: ±100ppm/℃; Temperature Rating: -55℃~+155℃; ComponentLink1Description: Datasheet; ComponentLink1URL: https://wmsc.lcsc.com/wmsc/upload/file/pdf/v2/lcsc/2308241947_FOJAN-FRC2512J274-TS_C2960831.pdf; ComponentLink2Description: JLCPCB Part URL; ComponentLink2URL: https://jlcpcb.com/partdetail/C2960831
pins: 1, 2
1 alternate drawing of the same symbol

## FRC2512J300 TS
designator R?  Resistance: 30Ω  (hidden comment: *)
Resistor, 30Ω, ±5%, 1W, 200V, ±100ppm/℃, -55℃~+155℃, SMD 2512; Manufacturer: Uniroyal; Manufacturer Part Number: FRC2512J300 TS; Supplier 1: LCSC; Supplier Part Number 1: C2934107; JLCPCB Part Number: C2934107; Power Rating: 1W; Category: Resistors; Package Size: 2512; JLCPCB Basic Part: Yes; Tolerance: ±5%; Voltage Rating: 200V; Temperature Coefficient: ±100ppm/℃; Temperature Rating: -55℃~+155℃; ComponentLink1Description: Datasheet; ComponentLink1URL: https://wmsc.lcsc.com/wmsc/upload/file/pdf/v2/lcsc/2308241947_FOJAN-FRC2512J300-TS_C2934107.pdf; ComponentLink2Description: JLCPCB Part URL; ComponentLink2URL: https://jlcpcb.com/partdetail/C2934107
pins: 1, 2
1 alternate drawing of the same symbol

## FRC2512J301 TS
designator R?  Resistance: 300Ω  (hidden comment: *)
Resistor, 300Ω, ±5%, 1W, 200V, ±100ppm/℃, -55℃~+155℃, SMD 2512; Manufacturer: Uniroyal; Manufacturer Part Number: FRC2512J301 TS; Supplier 1: LCSC; Supplier Part Number 1: C2934108; JLCPCB Part Number: C2934108; Power Rating: 1W; Category: Resistors; Package Size: 2512; JLCPCB Basic Part: Yes; Tolerance: ±5%; Voltage Rating: 200V; Temperature Coefficient: ±100ppm/℃; Temperature Rating: -55℃~+155℃; ComponentLink1Description: Datasheet; ComponentLink1URL: https://wmsc.lcsc.com/wmsc/upload/file/pdf/v2/lcsc/2308241947_FOJAN-FRC2512J301-TS_C2934108.pdf; ComponentLink2Description: JLCPCB Part URL; ComponentLink2URL: https://jlcpcb.com/partdetail/C2934108
pins: 1, 2
1 alternate drawing of the same symbol

## FRC2512J302 TS
designator R?  Resistance: 3kΩ  (hidden comment: *)
Resistor, 3kΩ, ±5%, 1W, 200V, ±100ppm/℃, -55℃~+155℃, SMD 2512; Manufacturer: Uniroyal; Manufacturer Part Number: FRC2512J302 TS; Supplier 1: LCSC; Supplier Part Number 1: C2934109; JLCPCB Part Number: C2934109; Power Rating: 1W; Category: Resistors; Package Size: 2512; JLCPCB Basic Part: Yes; Tolerance: ±5%; Voltage Rating: 200V; Temperature Coefficient: ±100ppm/℃; Temperature Rating: -55℃~+155℃; ComponentLink1Description: Datasheet; ComponentLink1URL: https://wmsc.lcsc.com/wmsc/upload/file/pdf/v2/lcsc/2308241947_FOJAN-FRC2512J302-TS_C2934109.pdf; ComponentLink2Description: JLCPCB Part URL; ComponentLink2URL: https://jlcpcb.com/partdetail/C2934109
pins: 1, 2
1 alternate drawing of the same symbol

## FRC2512J303 TS
designator R?  Resistance: 30kΩ  (hidden comment: *)
Resistor, 30kΩ, ±5%, 1W, 200V, ±100ppm/℃, SMD 2512; Manufacturer: Uniroyal; Manufacturer Part Number: FRC2512J303 TS; Supplier 1: LCSC; Supplier Part Number 1: C2934110; JLCPCB Part Number: C2934110; Power Rating: 1W; Category: Resistors; Package Size: 2512; JLCPCB Basic Part: Yes; Tolerance: ±5%; Voltage Rating: 200V; Temperature Coefficient: ±100ppm/℃; ComponentLink1Description: Datasheet; ComponentLink1URL: https://wmsc.lcsc.com/wmsc/upload/file/pdf/v2/lcsc/2308241947_FOJAN-FRC2512J303-TS_C2934110.pdf; ComponentLink2Description: JLCPCB Part URL; ComponentLink2URL: https://jlcpcb.com/partdetail/C2934110
pins: 1, 2
1 alternate drawing of the same symbol

## FRC2512J304 TS
designator R?  Resistance: 300kΩ  (hidden comment: *)
Resistor, 300kΩ, ±5%, 1W, 200V, ±100ppm/℃, SMD 2512; Manufacturer: Uniroyal; Manufacturer Part Number: FRC2512J304 TS; Supplier 1: LCSC; Supplier Part Number 1: C3013331; JLCPCB Part Number: C3013331; Power Rating: 1W; Category: Resistors; Package Size: 2512; JLCPCB Basic Part: Yes; Tolerance: ±5%; Voltage Rating: 200V; Temperature Coefficient: ±100ppm/℃; ComponentLink1Description: Datasheet; ComponentLink1URL: https://wmsc.lcsc.com/wmsc/upload/file/pdf/v2/lcsc/2308241947_FOJAN-FRC2512J304-TS_C3013331.pdf; ComponentLink2Description: JLCPCB Part URL; ComponentLink2URL: https://jlcpcb.com/partdetail/C3013331
pins: 1, 2
1 alternate drawing of the same symbol